# Altium footprint library LFI Power Board PcbLib1.PcbLib: 43 footprints (part 1 of 3)
Each footprint in its own frame and in the unit in brackets; x right, y up, seen from the top. Pads: shape width x height; smd on the part's side, far side on the other; paste and mask are expansions set on the pad; w line width, h text height; cw(c..) or ccw(c..) is an arc to the next point about the centre after c.
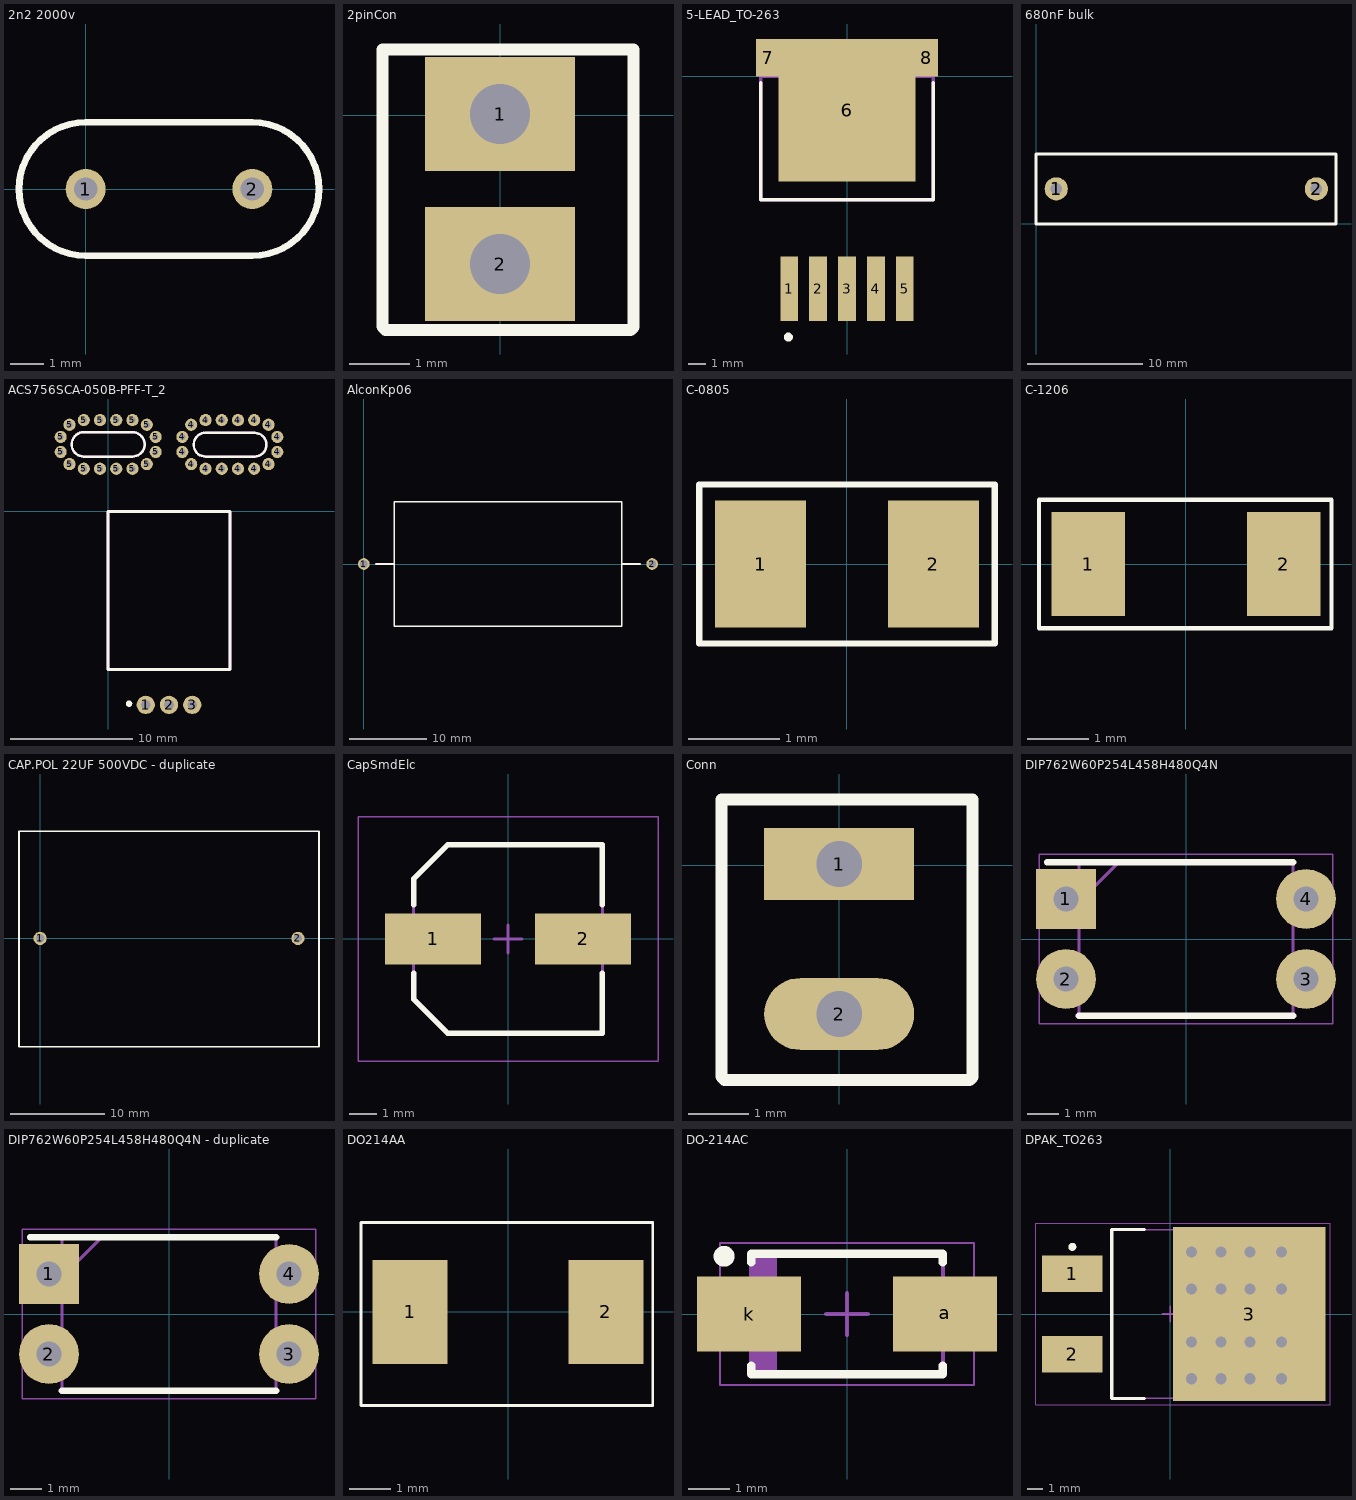
[diagram p0: the footprints below, top view; thin cyan lines are the x and y axes]

## 2n2 2000v [mm]
pads (2):
  round 1.2 hole 0.7: 1(0,0) 2(5,0)
Top Overlay:
  lines w0.2: 0,-2 cw(c0,0) 0,2 5,2 cw(c5,0) 5,-2 0,-2
3D body "User Library-TDK_CAP_CK45_.STEP": height 12.5, standoff -5, extent -3.046,-2.475 7.947,2.525

## 2pinCon [mm]
pads (2):
  rect 2.5x1.9 hole 1: 1(0,0.025) 2(0,-2.475)
Top Overlay:
  lines w0.2: -1.965,-3.52 -1.91,-3.575 2.175,-3.575 2.225,-3.525 2.225,1.1 -1.965,1.1 -1.965,-3.52
3D body: height 1.4, standoff -1.4, extent -5,-0.775 -5,-0.775
3D body "User Library-Molex - 2-Pin Header with Lock (0_100in pitch).STEP": height 10.68, standoff -3.54, extent -3.302,-3.81 3.048,1.27

## 5-LEAD_TO-263 [mm]
pads (8):
  rect 1.05x3.8 smd: 1(-3.404,-12.5) 2(-1.702,-12.5) 3(0,-12.5) 4(1.702,-12.5) 5(3.404,-12.5)
  rect 8.05x8.4 smd: 6(0,-2)
  rect 1.35x2.2 smd: 7(-4.675,1.1) 8(4.675,1.1)
Top Overlay:
  circle w0.3: c-3.455,-15.36 r0.113
  lines w0.2: -5.08,-0.379 -5.08,-7.26 5.08,-7.26 5.08,-0.379
Mechanical 13:
  lines w0.2: -5.08,-7.26 5.08,-7.26 5.08,0 -5.08,0 -5.08,-7.26

## 680nF bulk [mm]
pads (2):
  round 2 hole 1: 1(1.75,3) 2(24.25,3)
Top Overlay:
  lines w0.254: 0,-0.025 25.95,-0.025 25.95,6 0,6 0,-0.025
3D body "WIMA_FILM_CAPACITOR_RADIAL_26.5x6.0x15.0_P22.5.step": height 15, standoff -3.5, extent -0.35,-0.05 26.15,5.95

## ACS756SCA-050B-PFF-T_2 [mm]
pads (35):
  round 1.5 hole 0.8: 1(3.09,-15.9) 2(5,-15.9) 3(6.91,-15.9)
  round 1 hole 0.5: 4(6.098,4.882) 4(6.098,6.118) 4(6.824,3.882) 4(6.824,7.118) 4(8,3.5) 4(8,7.5) 4(9.333,3.5) 4(9.333,7.5) 4(10.667,3.5) 4(10.667,7.5) 4(12,3.5) 4(12,7.5) 4(13.176,3.882) 4(13.176,7.118) 4(13.902,4.882) 4(13.902,6.118) 5(-3.902,4.882) 5(-3.902,6.118) 5(-3.176,3.882) 5(-3.176,7.118) 5(-2,3.5) 5(-2,7.5) 5(-0.667,3.5) 5(-0.667,7.5) 5(0.667,3.5) 5(0.667,7.5) 5(2,3.5) 5(2,7.5) 5(3.176,3.882) 5(3.176,7.118) 5(3.902,4.882) 5(3.902,6.118)
Top Overlay:
  circle w0.254: c1.715,-15.803 r0.139
  lines w0.2: -2,4.5 cw(c-2,5.5) -2,6.5 2,6.5 cw(c2,5.5) 2,4.5 -2,4.5 ; 8,4.5 cw(c8,5.477) 8,6.455 12.057,6.455 cw(c12.028,5.477) 12.057,4.5 8,4.5
  lines w0.254: 0,-13 10,-13 10,0 0,0 0,-13
Mechanical 13:
  lines w0.2: -2,4.5 cw(c-2,5.5) -2,6.5 2,6.5 cw(c2,5.5) 2,4.5 -2,4.5 ; 8,4.5 cw(c8,5.477) 8,6.455 12.057,6.455 cw(c12.028,5.478) 12.057,4.5 8,4.5
  lines w0.254: 0,-13 10,-13 10,0 0,0 0,-13

## AlconKp06 [mm]
pads (2):
  round 1.5 hole 1: 1(0,0) 2(37,0)
Top Overlay:
  lines w0.2: 1.5,0 3.925,0 ; 33.075,0 35.5,0 ; 3.925,0 3.925,8 33.075,8 33.075,-8 3.925,-8 3.925,0
3D body "User Library-CAP ICEL 1200 0_22.STEP": height 18.01, standoff -5.99, extent -1,-8.975 38,9.025

## C-0805 [mm]
pads (2):
  rect 1x1.4 smd: 1(-0.95,0) 2(0.95,0)
Top Overlay:
  lines w0.07: -1.625,-0.875 -0.391,-0.875 0.416,-0.875 1.625,-0.875 1.625,0.875 -1.625,0.875 -1.625,0.413 -1.625,-0.875
3D body "User Library-CAPC2013X10.STEP": height 1.01, standoff 0.01, extent -1,-0.625 1,0.625

## C-1206 [mm]
pads (2):
  rect 1.2x1.7 smd: 1(-1.6,0) 2(1.6,0)
Top Overlay:
  lines w0.07: -2.4,-1.05 2.375,-1.05 2.375,-0.531 2.375,0.556 2.375,0.692 2.375,1.05 -2.4,1.05 -2.4,-1.05
3D body "User Library-CAPC3216X10.STEP": height 1, standoff 0, extent -1.6,-0.8 1.6,0.8

## CAP.POL 22UF 500VDC - duplicate [mm]
pads (2):
  round 1.4 hole 0.9: 1(0,0) 2(27.5,0)
Top Overlay:
  lines w0.2: -2.25,-11.557 -2.25,-5.807 -2.25,5.693 -2.25,11.43 29.75,11.43 29.75,-11.557 -2.25,-11.557
3D body "c-rect_p27-5_l30_w13_h23.stp": height 23.01, standoff -3.99, extent -1.225,-6.45 28.775,6.55

## CapSmdElc [mm] "Aluminum Electrolytic Capacitor, Body 6.70x6.70x6.30mm, IPC Low Density"
height 6.3
pads (2):
  rect 3.45x1.85 smd: 1(-2.7,0) 2(2.7,0)
Top Overlay:
  lines w0.2: -3.4,-1.225 -3.4,-2.163 -2.163,-3.4 3.4,-3.4 3.4,-1.225 ; -3.4,1.225 -3.4,2.163 -2.163,3.4 3.4,3.4 3.4,1.225
Assembly Top:
  lines w0.1: -3.4,-2.163 -2.163,-3.4 3.4,-3.4 3.4,3.4 -2.163,3.4 -3.4,2.163 -3.4,-2.163
Courtyard Top:
  lines w0.05: -5.4,-4.4 -5.4,4.4 5.4,4.4 5.4,-4.4 -5.4,-4.4
  lines w0.1: -0.5,0 0.5,0 ; 0,-0.5 0,0.5
3D body "User Library-Nichicon_CW6_3x7.STEP": height 6.92, standoff 0.01, extent -3.45,-3.275 3.55,3.325

## Conn [mm]
pads (2):
  rect 2.5x1.2 hole 0.762 square: 1(0,0.025)
  oval 2.5x1.2 hole 0.762 square: 2(0,-2.475)
Top Overlay:
  lines w0.2: -1.965,-3.52 -1.965,1.1 2.225,1.1 2.225,-3.525 2.175,-3.575 -1.91,-3.575 -1.965,-3.52

## DIP762W60P254L458H480Q4N [mm]
pads (4):
  rect 1.9x1.9 hole 0.8: 1(-3.81,1.27)
  round 1.9 hole 0.8: 2(-3.81,-1.27) 3(3.81,-1.27) 4(3.81,1.27)
Top Overlay:
  lines w0.2: -4.41,2.44 3.4,2.44 ; -3.4,-2.44 3.4,-2.44
Mechanical 13:
  lines w0.1: -3.4,1.17 -2.13,2.44 ; -3.4,-2.44 3.4,-2.44 3.4,2.44 -3.4,2.44 -3.4,-2.44
Mechanical 15:
  lines w0.05: -4.66,-2.69 4.66,-2.69 4.66,2.69 -4.66,2.69 -4.66,-2.69
3D body "EL817(C).stp": height 4.8, standoff -3.5, extent -3.96,-2.29 3.96,2.29

## DIP762W60P254L458H480Q4N - duplicate [mm]
pads (4):
  rect 1.9x1.9 hole 0.8: 1(-3.81,1.27)
  round 1.9 hole 0.8: 2(-3.81,-1.27) 3(3.81,-1.27) 4(3.81,1.27)
Top Overlay:
  lines w0.2: -4.41,2.44 3.4,2.44 ; -3.4,-2.44 3.4,-2.44
Mechanical 13:
  lines w0.1: -3.4,1.17 -2.13,2.44 ; -3.4,-2.44 3.4,-2.44 3.4,2.44 -3.4,2.44 -3.4,-2.44
Mechanical 15:
  lines w0.05: -4.66,-2.69 4.66,-2.69 4.66,2.69 -4.66,2.69 -4.66,-2.69
3D body "EL817(C).stp": height 4.8, standoff -3.5, extent -3.96,-2.29 3.96,2.29

## DO214AA [mm]
pads (2):
  rect 1.8x2.5 smd: 1(-2.35,0) 2(2.35,0)
Top Overlay:
  lines w0.07: -3.525,-2.25 3.475,-2.25 3.475,2.15 -3.525,2.15 -3.525,1.025 -3.525,-2.25
3D body "User Library-DO-214AA(SMB).STEP": height 2.48, standoff -0.35, extent -2.84,-2.025 2.838,1.925

## DO-214AC [mm]
height 1.35
pads (2):
  rect 2.5x1.8 smd: a(2.35,0) k(-2.35,0)
Top Overlay:
  circle w0.25: c-2.95,1.385 r0.125
  lines w0.2: -2.3,-1.235 -2.3,-1.45 2.3,-1.45 2.3,-1.235 ; -2.3,1.235 -2.3,1.45 2.3,1.45 2.3,1.235
Assembly Top:
  rectangle: -2.3,-1.45 -1.681,1.45
  lines w0.1: -2.3,-1.45 2.3,-1.45 2.3,1.45 -2.3,1.45 -2.3,-1.45
Courtyard Top:
  lines w0.05: -3.05,-1.7 3.05,-1.7 3.05,1.7 -3.05,1.7 -3.05,-1.7
  lines w0.1: -0.5,0 0.5,0 ; 0,-0.5 0,0.5
3D body "User Library-DO-214AC(SMA).STEP": height 2.3, standoff 0.01, extent -2.768,-1.422 2.718,1.372

## DPAK_TO263 [mm] "D2-PAK, 3-Pads, Body 7.93x8.70mm (max), IPC Medium Density"
height 4.8
pads (3):
  rect 3.81x2.32 smd: 1(-6.2,2.54) 2(-6.2,-2.54)
  rect 9.65x11 smd: 3(5,0)
via 7.05,-4.1 diameter 1.27 hole 0.711
via 5.05,-4.1 diameter 1.27 hole 0.711
via 3.225,-4.1 diameter 1.27 hole 0.711
via 1.35,-4.1 diameter 1.27 hole 0.711
via 7.05,-1.775 diameter 1.27 hole 0.711
via 5.05,-1.775 diameter 1.27 hole 0.711
via 3.225,-1.775 diameter 1.27 hole 0.711
via 1.35,-1.775 diameter 1.27 hole 0.711
via 7.05,1.575 diameter 1.27 hole 0.711
via 5.05,1.575 diameter 1.27 hole 0.711
via 3.225,1.575 diameter 1.27 hole 0.711
via 1.35,1.575 diameter 1.27 hole 0.711
via 7.05,3.925 diameter 1.27 hole 0.711
via 5.05,3.925 diameter 1.27 hole 0.711
via 3.225,3.925 diameter 1.27 hole 0.711
via 1.35,3.925 diameter 1.27 hole 0.711
Top Overlay:
  circle w0.25: c-6.2,4.25 r0.125
  lines w0.2: -1.625,-5.35 -3.7,-5.35 -3.7,5.35 -1.625,5.35
Assembly Top:
  lines w0.1: -3.7,-5.325 -3.7,5.325 5.95,5.325 5.95,-5.325 -3.7,-5.325
Courtyard Top:
  lines w0.05: -8.5,-5.75 -8.5,5.75 10.125,5.75 10.125,-5.75 -8.5,-5.75
  lines w0.1: -0.5,0 0.5,0 ; 0,-0.5 0,0.5
3D body "User Library-TO263-3S.STEP": height 4.81, standoff 0.01, extent -7.515,-4.975 8.155,5.025